# Altium footprint library My_Intlib.PcbLib: 224 footprints (part 7 of 14)
Each footprint in its own frame and in the unit in brackets; x right, y up, seen from the top. Pads: shape width x height; smd on the part's side, far side on the other; paste and mask are expansions set on the pad; w line width, h text height; cw(c..) or ccw(c..) is an arc to the next point about the centre after c.
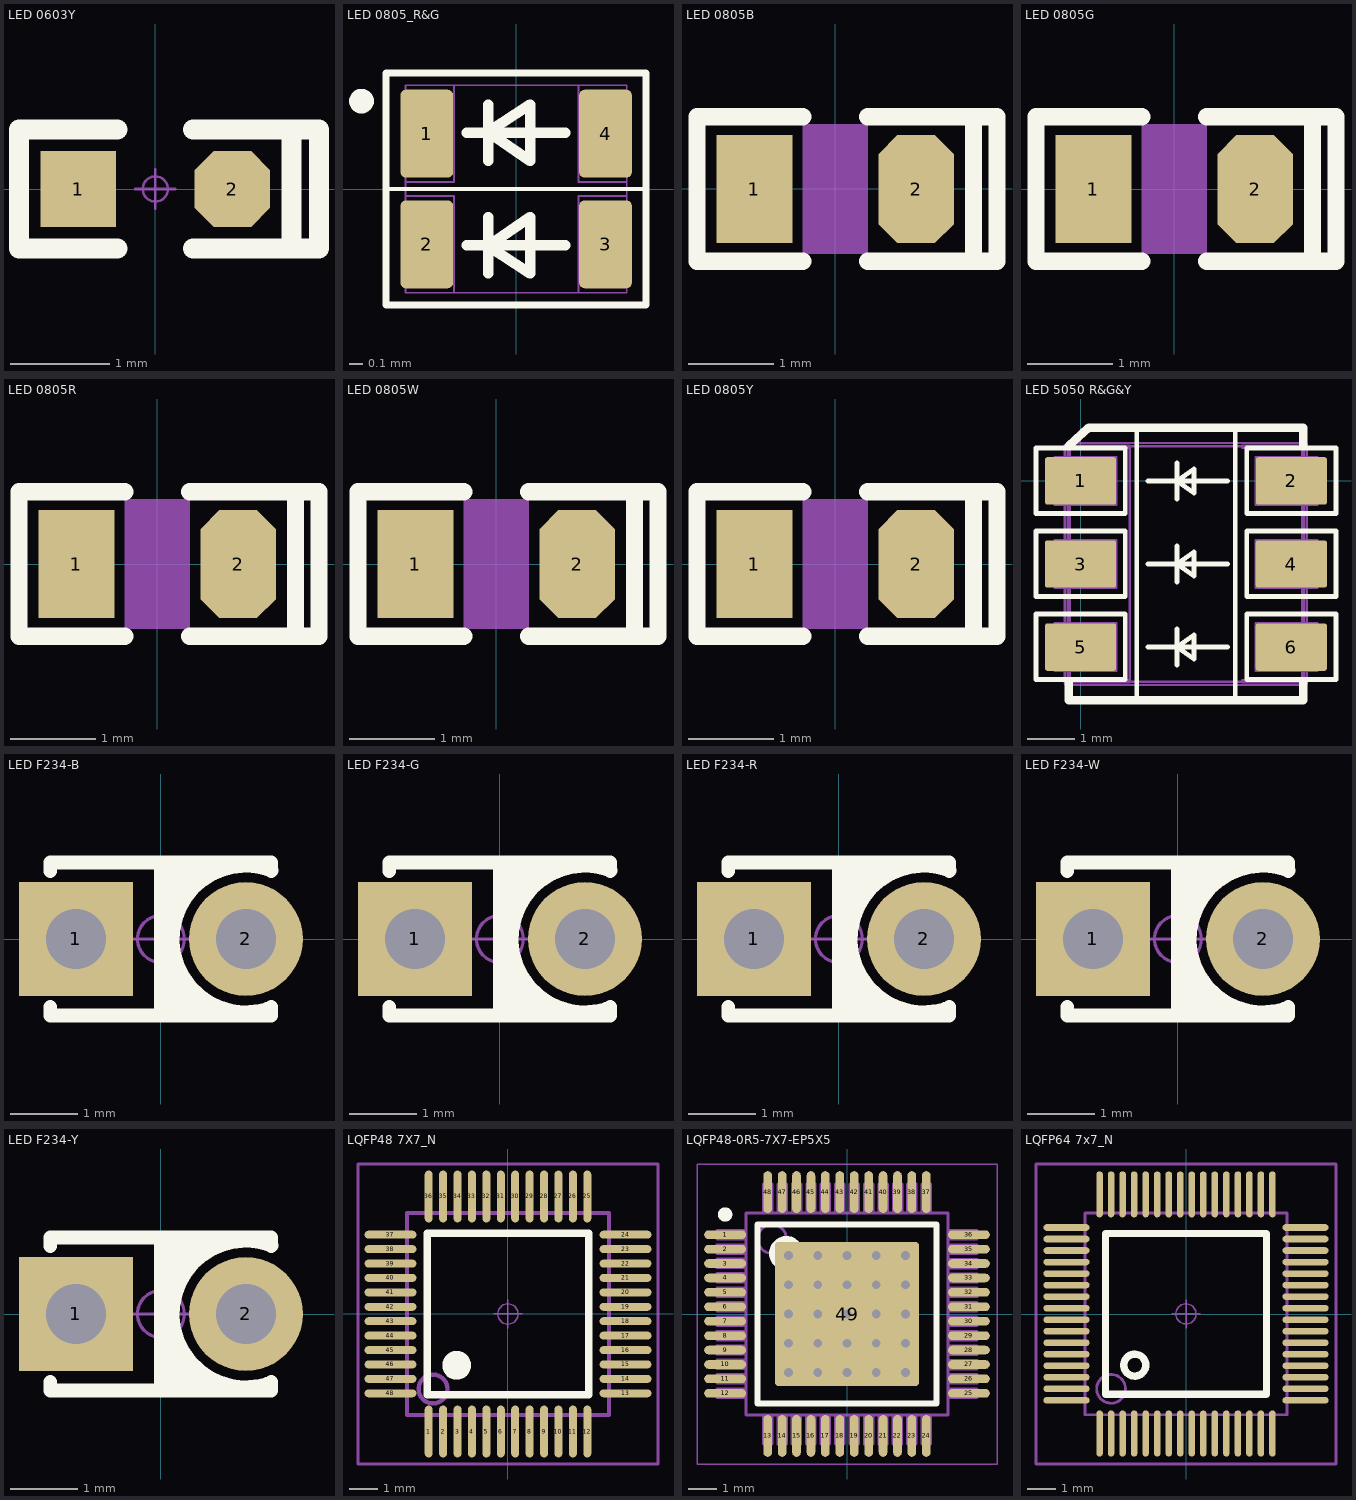
[diagram p6: the footprints below, top view; thin cyan lines are the x and y axes]

## LED 0603Y [mil] "黄色0603LED"
pads (2):
  rect 30x30 smd: 1(-30.59,0)
  oct 30x30 smd: 2(30.59,0)
Top Overlay:
  lines w8: -15,-23.62 -54.13,-23.62 -54.13,23.62 -15,23.62 ; 15,-23.62 65,-23.62 65,23.62 15,23.62 ; 54.13,-23.62 54.13,23.62
Top Value:
  text ".Comment" at 84.09,-26.46 h35
Top Assembly:
  text ".Designator" at 84.09,4.78 h35
Mechanical 15:
  circle w1: c0,0 r5
  lines w1: -7.87,0 7.87,0 ; 0,-7.87 0,7.87
3D body "LED 0603-Y.STEP": height 18.36, standoff -0.16, extent -31.5,-16.04 31.5,15.54
3D body "LED 0603玻璃罩.STEP": height 23.82, standoff 8.07, extent -23.63,-15.75 23.62,15.74

## LED 0805_R&G [mm] "LED红绿双色，0805，1.6mm*1.5mm"
pads (4):
  rrect20% 0.381x0.635 smd mask+0.038: 1(-0.646,0.4) 2(-0.646,-0.4) 3(0.646,-0.4) 4(0.646,0.4)
Top Overlay:
  circle w0.127: c-1.118,0.635 r0.025
  lines w0.025: -0.94,0 0.94,0
  lines w0.051: -0.94,-0.838 0.94,-0.838 0.94,0 0.94,0.838 -0.94,0.838 -0.94,0 -0.94,-0.838
  lines w0.076: -0.356,-0.406 0.356,-0.406 ; -0.356,0.406 0.356,0.406 ; -0.203,-0.61 -0.203,-0.411 ; -0.203,-0.203 -0.203,-0.401 ccw(c-0.198,-0.401) -0.198,-0.406 ccw(c-0.198,-0.411) -0.203,-0.411 ; -0.203,0.203 -0.203,0.401 cw(c-0.198,0.401) -0.198,0.406 cw(c-0.198,0.411) -0.203,0.411 ; -0.203,0.61 -0.203,0.411 ; -0.203,-0.411 0.102,-0.61 0.102,-0.203 -0.203,-0.411 ; -0.203,0.411 0.102,0.61 0.102,0.203 -0.203,0.411
Top Value:
  text ".Comment" at 1.168,-0.687 h0.89
Top Assembly:
  text ".Designator" at 1.168,0.106 h0.89
Mechanical 15:
  lines w0.013: -0.575,-0.05 -0.8,-0.05 ; -0.575,0.05 -0.8,0.05 ; 0.575,-0.05 0.8,-0.05 ; 0.575,0.05 0.8,0.05 ; -0.8,-0.75 -0.8,0.75 ; -0.8,-0.75 -0.8,-0.625 ccw(c-0.8,-0.4) -0.8,-0.175 -0.8,0.175 ccw(c-0.8,0.4) -0.8,0.625 -0.8,0.75 ; -0.8,-0.75 0.8,-0.75 ; -0.8,-0.75 0.8,-0.75 ; -0.8,-0.05 -0.8,0.05 ; -0.8,-0.05 -0.45,-0.05 -0.45,-0.75 0.45,-0.75 0.45,-0.05 0.8,-0.05 ; -0.8,0.05 -0.45,0.05 -0.45,0.75 0.45,0.75 0.45,0.05 0.8,0.05 ; -0.8,0.75 0.8,0.75 ; -0.8,0.75 0.8,0.75 ; 0.8,-0.75 0.8,-0.625 cw(c0.8,-0.4) 0.8,-0.175 0.8,0.175 cw(c0.8,0.4) 0.8,0.625 0.8,0.75 ; 0.8,-0.75 0.8,0.75 ; 0.8,-0.05 0.8,0.05
3D body "黄绿双色LED.STEP": height 0.15, standoff 0, extent -0.775,-0.75 0.825,0.75
3D body "黄绿双色LED灯罩.STEP": height 0.4, standoff 0.1, extent -0.553,-0.75 0.597,0.75

## LED 0805B [mil] "蓝色0805LED"
pads (2):
  rect 35x50 smd: 1(-37.4,-0.01)
  oct 35x50 smd: 2(37.4,-0.01)
Top Overlay:
  lines w8: -15,-33.47 -63.98,-33.47 -63.98,33.46 -15,33.46 ; 15,-33.47 74.8,-33.47 74.8,33.46 15,33.46 ; 63.98,-33.47 63.98,32.48
Mechanical 1:
  pour cut-out: -15,30 15,30 15,-30 -15,-30
Top Value:
  text ".Comment" at -52,-100.05 h35
Top Assembly:
  text ".Designator" at -52,-68.81 h35
Mechanical 15:
  circle w1: c0,0 r5
  lines w1: -7.87,0 7.87,0 ; 0,-7.87 0,7.87
3D body "LED 0805玻璃罩.STEP": height 31.69, standoff 12.01, extent -29.53,-24.61 29.53,24.6
3D body "LED 0805-B.STEP": height 26.33, standoff -0.16, extent -39.36,-24.64 39.37,24.65

## LED 0805G [mil] "绿色0805LED"
pads (2):
  rect 35x50 smd: 1(-37.4,0)
  oct 35x50 smd: 2(37.4,0)
Top Overlay:
  lines w8: -15,-33.46 -63.98,-33.46 -63.98,33.46 -15,33.46 ; 15,-33.46 74.8,-33.46 74.8,33.46 15,33.46 ; 63.98,-33.46 63.98,32.48
Mechanical 1:
  pour cut-out: -15,30 15,30 15,-30 -15,-30
Top Value:
  text ".Comment" at -49,-95.05 h35
Top Assembly:
  text ".Designator" at -49,-63.81 h35
Mechanical 15:
  circle w1: c0,0 r5
  lines w1: -7.87,0 7.87,0 ; 0,-7.87 0,7.87
3D body "LED 0805-G.STEP": height 26.33, standoff -0.16, extent -39.37,-24.64 39.37,24.65
3D body "LED 0805玻璃罩.STEP": height 31.69, standoff 12.01, extent -29.53,-24.6 29.53,24.6

## LED 0805R [mil] "红色0805LED"
pads (2):
  rect 35x50 smd: 1(-37.41,0)
  oct 35x50 smd: 2(37.4,0)
Top Overlay:
  lines w8: -15,-33.46 -63.98,-33.46 -63.98,33.47 -15,33.47 ; 15,-33.46 74.8,-33.46 74.8,33.47 15,33.47 ; 63.98,-33.46 63.98,32.48
Mechanical 1:
  pour cut-out: -15,30 15,30 15,-30 -15,-30
Top Value:
  text ".Comment" at -58,-96.05 h35
Top Assembly:
  text ".Designator" at -58,-64.81 h35
Mechanical 15:
  circle w1: c0,0 r5
  lines w1: -7.87,0 7.87,0 ; 0,-7.87 0,7.87
3D body "LED 0805玻璃罩.STEP": height 31.69, standoff 12.01, extent -29.53,-24.6 29.53,24.61
3D body "LED 0805-R.STEP": height 26.33, standoff -0.16, extent -39.37,-24.64 39.37,24.65

## LED 0805W [mm] "白色0805LED"
pads (2):
  rect 0.889x1.27 smd: 1(-0.95,0)
  oct 0.889x1.27 smd: 2(0.95,0)
Top Overlay:
  lines w0.203: -0.381,-0.85 -1.625,-0.85 -1.625,0.85 -0.381,0.85 ; 0.381,-0.85 1.9,-0.85 1.9,0.85 0.381,0.85 ; 1.625,-0.85 1.625,0.825
Mechanical 1:
  pour cut-out: -0.381,0.762 0.381,0.762 0.381,-0.762 -0.381,-0.762
Top Value:
  text ".Comment" at -1.219,-2.389 h0.89
Top Assembly:
  text ".Designator" at -1.219,-1.595 h0.89
Mechanical 15:
  circle w0.025: c0,0 r0.127
  lines w0.025: -0.2,0 0.2,0 ; 0,-0.2 0,0.2
3D body "LED 0805-W.STEP": height 0.67, standoff 0, extent -1,-0.626 1,0.626
3D body "LED 0805玻璃罩.STEP": height 0.8, standoff 0.31, extent -0.75,-0.625 0.75,0.625

## LED 0805Y [mm] "黄色0805LED"
pads (2):
  rect 0.889x1.27 smd: 1(-0.95,0)
  oct 0.889x1.27 smd: 2(0.95,0)
Top Overlay:
  lines w0.203: -0.381,-0.85 -1.625,-0.85 -1.625,0.85 -0.381,0.85 ; 0.381,-0.85 1.9,-0.85 1.9,0.85 0.381,0.85 ; 1.625,-0.85 1.625,0.825
Mechanical 1:
  pour cut-out: -0.381,0.762 0.381,0.762 0.381,-0.762 -0.381,-0.762
Top Value:
  text ".Comment" at -1.143,-2.592 h0.89
Top Assembly:
  text ".Designator" at -1.143,-1.799 h0.89
Mechanical 15:
  circle w0.025: c0,0 r0.127
  lines w0.025: -0.2,0 0.2,0 ; 0,-0.2 0,0.2
3D body "LED 0805-Y.STEP": height 0.67, standoff 0, extent -1,-0.626 1,0.626
3D body "LED 0805玻璃罩.STEP": height 0.8, standoff 0.31, extent -0.75,-0.625 0.75,0.625

## LED 5050 R&G&Y [mm] "LED红绿黄3色，5050，5mm*5mm"
pads (6):
  rrect10% 1.5x1 smd: 1(0,0) 2(4.442,0) 3(0,-1.75) 4(4.44,-1.75) 5(0,-3.5) 6(4.44,-3.5)
Top Overlay:
  lines w0.1: 0.546,1.118 3.894,1.118 ; 1.041,1.118 3.399,1.118 ; 1.181,-4.618 1.183,-4.229 1.183,1.118 ; 1.422,-3.5 3.099,-3.5 ; 1.422,-1.75 3.099,-1.75 ; 1.422,0 3.099,0 ; 2.032,-3.881 2.032,-3.119 ; 2.032,-2.131 2.032,-1.369 ; 2.032,-0.381 2.032,0.381 ; 3.256,-4.618 3.258,-4.229 3.258,1.118 ; -0.94,-4.186 0.94,-4.186 0.94,-2.805 -0.94,-2.805 -0.94,-4.186 ; -0.94,-2.436 0.94,-2.436 0.94,-1.055 -0.94,-1.055 -0.94,-2.436 ; -0.94,-0.686 0.94,-0.686 0.94,0.695 -0.94,0.695 -0.94,-0.686 ; 2.032,-3.5 2.388,-3.754 2.388,-3.246 2.032,-3.5 ; 2.032,-1.75 2.388,-2.004 2.388,-1.496 2.032,-1.75 ; 2.032,0 2.388,-0.254 2.388,0.254 2.032,0 ; 3.502,-4.186 5.381,-4.186 5.381,-2.805 3.502,-2.805 3.502,-4.186 ; 3.502,-2.436 5.381,-2.436 5.381,-1.055 3.502,-1.055 3.502,-2.436 ; 3.502,-0.686 5.381,-0.686 5.381,0.695 3.502,0.695 3.502,-0.686
  lines w0.178: -0.254,-4.237 -0.254,-4.618 4.696,-4.618 4.696,-4.237 ; -0.254,0.737 0.169,1.118 4.696,1.118 4.696,0.737
Top Value:
  text ".Comment" at 5.664,-2.135 h0.89
Top Assembly:
  text ".Designator" at 5.664,-1.341 h0.89
Mechanical 15:
  drawing of 4346 lines, arcs and shapes, not listed
3D body "5050 RGB led灯罩.STEP": height 1.35, standoff 0.95, extent 0.051,-3.927 4.442,0.473
3D body "5050 RGB led.STEP": height 1.6, standoff 0, extent -0.561,-4.3 4.979,0.8

## LED F234-B [mm] "蓝色2mm*3mm*4mm(长*宽*高)"
pads (2):
  rect 1.7x1.7 hole 0.9: 1(-1.27,0)
  round 1.7 hole 0.9: 2(1.27,0)
Top Overlay:
  lines w0.203: -1.651,-1.016 -1.651,-1.143 1.651,-1.143 1.651,-1.016 ; -1.651,1.016 -1.651,1.143 1.651,1.143 1.651,1.016 ; 0,-1.143 0,1.143 ; 0,-0.889 0.254,-1.143 ; 0,-0.635 0.508,-1.143 ; 0,-0.381 0.762,-1.143 ; 0,0.381 0.762,1.143 ; 0,0.635 0.508,1.143 ; 0,0.889 0.254,1.143 ; 0.127,-0.635 0.127,0.508 ; 1.584,-1.046 cw(c1.27,0) 1.654,1.023
Mechanical 15:
  circle w0.05: c0,0 r0.35
  lines w0.05: -0.5,0 0.5,0 ; 0,-0.5 0,0.5
3D body "LED F234-B.STEP": height 3.01, standoff -3.45, extent -1.52,-0.838 1.52,0.838
3D body "LED F234透明罩.STEP": height 4.05, standoff 0.05, extent -1.5,-1 1.5,1

## LED F234-G [mm] "绿色2mm*3mm*4mm(长*宽*高)"
pads (2):
  rect 1.7x1.7 hole 0.9: 1(-1.27,0)
  round 1.7 hole 0.9: 2(1.27,0)
Top Overlay:
  lines w0.203: -1.651,-1.016 -1.651,-1.143 1.651,-1.143 1.651,-1.016 ; -1.651,1.016 -1.651,1.143 1.651,1.143 1.651,1.016 ; 0,-1.143 0,1.143 ; 0,-0.889 0.254,-1.143 ; 0,-0.635 0.508,-1.143 ; 0,-0.381 0.762,-1.143 ; 0,0.381 0.762,1.143 ; 0,0.635 0.508,1.143 ; 0,0.889 0.254,1.143 ; 0.127,-0.635 0.127,0.508 ; 1.584,-1.046 cw(c1.27,0) 1.654,1.023
Mechanical 15:
  circle w0.05: c0,0 r0.35
  lines w0.05: -0.5,0 0.5,0 ; 0,-0.5 0,0.5
3D body "LED F234透明罩.STEP": height 4.05, standoff 0.05, extent -1.5,-1 1.5,1
3D body "LED F234-G.STEP": height 3.01, standoff -3.45, extent -1.52,-0.838 1.52,0.838

## LED F234-R [mm] "红色2mm*3mm*4mm(长*宽*高)"
pads (2):
  rect 1.7x1.7 hole 0.9: 1(-1.27,0)
  round 1.7 hole 0.9: 2(1.27,0)
Top Overlay:
  lines w0.203: -1.651,-1.016 -1.651,-1.143 1.651,-1.143 1.651,-1.016 ; -1.651,1.016 -1.651,1.143 1.651,1.143 1.651,1.016 ; 0,-1.143 0,1.143 ; 0,-0.889 0.254,-1.143 ; 0,-0.635 0.508,-1.143 ; 0,-0.381 0.762,-1.143 ; 0,0.381 0.762,1.143 ; 0,0.635 0.508,1.143 ; 0,0.889 0.254,1.143 ; 0.127,-0.635 0.127,0.508 ; 1.584,-1.046 cw(c1.27,0) 1.654,1.023
Mechanical 15:
  circle w0.05: c0,0 r0.35
  lines w0.05: -0.5,0 0.5,0 ; 0,-0.5 0,0.5
3D body "LED F234-R.STEP": height 3.01, standoff -3.45, extent -1.52,-0.838 1.52,0.838
3D body "LED F234透明罩.STEP": height 4.05, standoff 0.05, extent -1.5,-1 1.5,1

## LED F234-W [mm] "透明色2mm*3mm*4mm(长*宽*高)"
pads (2):
  rect 1.7x1.7 hole 0.9: 1(-1.27,0)
  round 1.7 hole 0.9: 2(1.27,0)
Top Overlay:
  lines w0.203: -1.651,-1.016 -1.651,-1.143 1.651,-1.143 1.651,-1.016 ; -1.651,1.016 -1.651,1.143 1.651,1.143 1.651,1.016 ; 0,-1.143 0,1.143 ; 0,-0.889 0.254,-1.143 ; 0,-0.635 0.508,-1.143 ; 0,-0.381 0.762,-1.143 ; 0,0.381 0.762,1.143 ; 0,0.635 0.508,1.143 ; 0,0.889 0.254,1.143 ; 0.127,-0.635 0.127,0.508 ; 1.584,-1.046 cw(c1.27,0) 1.654,1.023
Mechanical 15:
  circle w0.05: c0,0 r0.35
  lines w0.05: -0.5,0 0.5,0 ; 0,-0.5 0,0.5
3D body "LED F234-W.STEP": height 3.01, standoff -3.45, extent -1.52,-0.838 1.52,0.838
3D body "LED F234透明罩.STEP": height 4.05, standoff 0.05, extent -1.5,-1 1.5,1

## LED F234-Y [mm] "黄色2mm*3mm*4mm(长*宽*高)"
pads (2):
  rect 1.7x1.7 hole 0.9: 1(-1.27,0)
  round 1.7 hole 0.9: 2(1.27,0)
Top Overlay:
  lines w0.203: -1.651,-1.016 -1.651,-1.143 1.651,-1.143 1.651,-1.016 ; -1.651,1.016 -1.651,1.143 1.651,1.143 1.651,1.016 ; 0,-1.143 0,1.143 ; 0,-0.889 0.254,-1.143 ; 0,-0.635 0.508,-1.143 ; 0,-0.381 0.762,-1.143 ; 0,0.381 0.762,1.143 ; 0,0.635 0.508,1.143 ; 0,0.889 0.254,1.143 ; 0.127,-0.635 0.127,0.508 ; 1.584,-1.046 cw(c1.27,0) 1.654,1.023
Mechanical 15:
  circle w0.05: c0,0 r0.35
  lines w0.05: -0.5,0 0.5,0 ; 0,-0.5 0,0.5
3D body "LED F234-Y.STEP": height 3.01, standoff -3.45, extent -1.52,-0.838 1.52,0.838
3D body "LED F234透明罩.STEP": height 4.05, standoff 0.05, extent -1.5,-1 1.5,1

## LQFP48 7X7_N [mm] "48脚，体宽7x7mm，脚距0.5mm"
height 1.6
pads (48):
  oval 0.279x1.8 smd: 1(-2.75,-4.075) 2(-2.25,-4.075) 3(-1.75,-4.075) 4(-1.25,-4.075) 5(-0.75,-4.075) 6(-0.25,-4.075) 7(0.25,-4.075) 8(0.75,-4.075) 9(1.25,-4.075) 10(1.75,-4.075) 11(2.25,-4.075) 12(2.75,-4.075) 25(2.75,4.075) 26(2.25,4.075) 27(1.75,4.075) 28(1.25,4.075) 29(0.75,4.075) 30(0.25,4.075) 31(-0.25,4.075) 32(-0.75,4.075) 33(-1.25,4.075) 34(-1.75,4.075) 35(-2.25,4.075) 36(-2.75,4.075)
  oval 1.8x0.279 smd: 13(4.075,-2.75) 14(4.075,-2.25) 15(4.075,-1.75) 16(4.075,-1.25) 17(4.075,-0.75) 18(4.075,-0.25) 19(4.075,0.25) 20(4.075,0.75) 21(4.075,1.25) 22(4.075,1.75) 23(4.075,2.25) 24(4.075,2.75) 37(-4.075,2.75) 38(-4.075,2.25) 39(-4.075,1.75) 40(-4.075,1.25) 41(-4.075,0.75) 42(-4.075,0.25) 43(-4.075,-0.25) 44(-4.075,-0.75) 45(-4.075,-1.25) 46(-4.075,-1.75) 47(-4.075,-2.25) 48(-4.075,-2.75)
Top Overlay:
  circle w0.5: c-1.778,-1.778 r0.25
  lines w0.254: -2.794,-2.794 2.794,-2.794 2.794,2.794 -2.794,2.794 -2.794,-2.794
Top Value:
  text ".Comment" at 5.69,0.126 h0.89
Top Assembly:
  text ".Designator" at 5.69,0.919 h0.89
Mechanical 13:
  circle w0.15: c-2.6,-2.6 r0.5
  lines w0.15: -3.5,-3.5 -3.5,3.5 3.5,3.5 3.5,-3.5 -3.5,-3.5
Mechanical 15:
  circle w0.05: c0,0 r0.35
  lines w0.05: -0.5,0 0.5,0 ; 0,-0.5 0,0.5
  lines w0.1: -5.2,-5.2 5.2,-5.2 5.2,5.2 -5.2,5.2 -5.2,-5.2
3D body "LQFP48-7x7.STEP": height 1.45, standoff 0, extent -4.503,-4.503 4.503,4.503

## LQFP48-0R5-7X7-EP5X5 [mm] "TSQFP, 48-Leads, Body 7.00x7.00mm, Pitch 0.50mm, IPC Medium Density"
height 1.45
pads (49):
  oval 1.45x0.3 smd mask+0.05: 1(-4.225,2.75) 2(-4.225,2.25) 3(-4.225,1.75) 4(-4.225,1.25) 5(-4.225,0.75) 6(-4.225,0.25) 7(-4.225,-0.25) 8(-4.225,-0.75) 9(-4.225,-1.25) 10(-4.225,-1.75) 11(-4.225,-2.25) 12(-4.225,-2.75) 25(4.225,-2.75) 26(4.225,-2.25) 27(4.225,-1.75) 28(4.225,-1.25) 29(4.225,-0.75) 30(4.225,-0.25) 31(4.225,0.25) 32(4.225,0.75) 33(4.225,1.25) 34(4.225,1.75) 35(4.225,2.25) 36(4.225,2.75)
  oval 0.3x1.45 smd mask+0.05: 13(-2.75,-4.225) 14(-2.25,-4.225) 15(-1.75,-4.225) 16(-1.25,-4.225) 17(-0.75,-4.225) 18(-0.25,-4.225) 19(0.25,-4.225) 20(0.75,-4.225) 21(1.25,-4.225) 22(1.75,-4.225) 23(2.25,-4.225) 24(2.75,-4.225) 37(2.75,4.225) 38(2.25,4.225) 39(1.75,4.225) 40(1.25,4.225) 41(0.75,4.225) 42(0.25,4.225) 43(-0.25,4.225) 44(-0.75,4.225) 45(-1.25,4.225) 46(-1.75,4.225) 47(-2.25,4.225) 48(-2.75,4.225)
  rrect5% 5x5 smd mask+0.05: 49(0,0)
via 1.016,1.016 diameter 0.584 hole 0.305
via 2.032,0 diameter 0.584 hole 0.305
via 1.016,0 diameter 0.584 hole 0.305
via 2.032,1.016 diameter 0.584 hole 0.305
via 0,1.016 diameter 0.584 hole 0.305
via 0,0 diameter 0.584 hole 0.305
via -2.032,-2.032 diameter 0.584 hole 0.305
via 2.032,-2.032 diameter 0.584 hole 0.305
via 1.016,-2.032 diameter 0.584 hole 0.305
via -1.016,-2.032 diameter 0.584 hole 0.305
via 0,-2.032 diameter 0.584 hole 0.305
via -2.032,2.032 diameter 0.584 hole 0.305
via 2.032,2.032 diameter 0.584 hole 0.305
via 1.016,2.032 diameter 0.584 hole 0.305
via -1.016,2.032 diameter 0.584 hole 0.305
via 0,2.032 diameter 0.584 hole 0.305
via -2.032,1.016 diameter 0.584 hole 0.305
via -2.032,0 diameter 0.584 hole 0.305
via -2.032,-1.016 diameter 0.584 hole 0.305
via 2.032,-1.016 diameter 0.584 hole 0.305
via 0,-1.016 diameter 0.584 hole 0.305
via -1.016,0 diameter 0.584 hole 0.305
via -1.016,-1.016 diameter 0.584 hole 0.305
via -1.016,1.016 diameter 0.584 hole 0.305
via 1.016,-1.016 diameter 0.584 hole 0.305
Top Overlay:
  circle w0.6: c-2.1,2.1 r0.3
  circle w0.25: c-4.225,3.45 r0.125
  lines w0.2: -3.1,-3.1 3.1,-3.1 3.1,3.1 -3.1,3.1 -3.1,-3.1
Top Value:
  text ".Comment" at -1.266,-1.135 h1
Top Assembly:
  circle w0.1: c-2.6,2.6 r0.5
  lines w0.1: -4.502,-2.897 -4.502,-2.6 -3.5,-2.6 ; -4.502,-2.397 -4.502,-2.1 -3.5,-2.1 ; -4.502,-1.897 -4.502,-1.6 -3.5,-1.6 ; -4.502,-1.397 -4.502,-1.1 -3.5,-1.1 ; -4.502,-0.897 -4.502,-0.6 -3.5,-0.6 ; -4.502,-0.397 -4.502,-0.1 -3.5,-0.1 ; -4.502,0.103 -4.502,0.4 -3.5,0.4 ; -4.502,0.603 -4.502,0.9 -3.5,0.9 ; -4.502,1.103 -4.502,1.4 -3.5,1.4 ; -4.502,1.603 -4.502,1.9 -3.5,1.9 ; -4.502,2.103 -4.502,2.4 -3.5,2.4 ; -4.502,2.603 -4.502,2.9 -3.5,2.9 ; -4.5,-2.897 -3.5,-2.897 ; -4.5,-2.397 -3.5,-2.397 ; -4.5,-1.897 -3.5,-1.897 ; -4.5,-1.397 -3.5,-1.397 ; -4.5,-0.897 -3.5,-0.897 ; -4.5,-0.397 -3.5,-0.397 ; -4.5,0.103 -3.5,0.103 ; -4.5,0.603 -3.5,0.603 ; -4.5,1.103 -3.5,1.103 ; -4.5,1.603 -3.5,1.603 ; -4.5,2.103 -3.5,2.103 ; -4.5,2.603 -3.5,2.603 ; -2.9,-3.5 -2.9,-4.502 -2.603,-4.502 ; -2.897,3.5 -2.897,4.5 ; -2.897,4.502 -2.6,4.502 -2.6,3.5 ; -2.603,-4.5 -2.603,-3.5 ; -2.4,-3.5 -2.4,-4.502 -2.103,-4.502 ; -2.397,3.5 -2.397,4.5 ; -2.397,4.502 -2.1,4.502 -2.1,3.5 ; -2.103,-4.5 -2.103,-3.5 ; -1.9,-3.5 -1.9,-4.502 -1.603,-4.502 ; -1.897,3.5 -1.897,4.5 ; -1.897,4.502 -1.6,4.502 -1.6,3.5 ; -1.603,-4.5 -1.603,-3.5 ; -1.4,-3.5 -1.4,-4.502 -1.103,-4.502 ; -1.397,3.5 -1.397,4.5 ; -1.397,4.502 -1.1,4.502 -1.1,3.5 ; -1.103,-4.5 -1.103,-3.5 ; -0.9,-3.5 -0.9,-4.502 -0.603,-4.502 ; -0.897,3.5 -0.897,4.5 ; -0.897,4.502 -0.6,4.502 -0.6,3.5 ; -0.603,-4.5 -0.603,-3.5 ; -0.4,-3.5 -0.4,-4.502 -0.103,-4.502 ; -0.397,3.5 -0.397,4.5 ; -0.397,4.502 -0.1,4.502 -0.1,3.5 ; -0.103,-4.5 -0.103,-3.5 ; 0.1,-3.5 0.1,-4.502 0.397,-4.502 ; 0.103,3.5 0.103,4.5 ; 0.103,4.502 0.4,4.502 0.4,3.5 ; 0.397,-4.5 0.397,-3.5 ; 0.6,-3.5 0.6,-4.502 0.897,-4.502 ; 0.603,3.5 0.603,4.5 ; 0.603,4.502 0.9,4.502 0.9,3.5 ; 0.897,-4.5 0.897,-3.5 ; 1.1,-3.5 1.1,-4.502 1.397,-4.502 ; 1.103,3.5 1.103,4.5 ; 1.103,4.502 1.4,4.502 1.4,3.5 ; 1.397,-4.5 1.397,-3.5 ; 1.6,-3.5 1.6,-4.502 1.897,-4.502 ; 1.603,3.5 1.603,4.5 ; 1.603,4.502 1.9,4.502 1.9,3.5 ; 1.897,-4.5 1.897,-3.5 ; 2.1,-3.5 2.1,-4.502 2.397,-4.502 ; 2.103,3.5 2.103,4.5 ; 2.103,4.502 2.4,4.502 2.4,3.5 ; 2.397,-4.5 2.397,-3.5 ; 2.6,-3.5 2.6,-4.502 2.897,-4.502 ; 2.603,3.5 2.603,4.5 ; 2.603,4.502 2.9,4.502 2.9,3.5 ; 2.897,-4.5 2.897,-3.5 ; 3.5,-2.9 4.502,-2.9 4.502,-2.603 ; 3.5,-2.603 4.5,-2.603 ; 3.5,-2.4 4.502,-2.4 4.502,-2.103 ; 3.5,-2.103 4.5,-2.103 ; 3.5,-1.9 4.502,-1.9 4.502,-1.603 ; 3.5,-1.603 4.5,-1.603 ; 3.5,-1.4 4.502,-1.4 4.502,-1.103 ; 3.5,-1.103 4.5,-1.103 ; 3.5,-0.9 4.502,-0.9 4.502,-0.603 ; 3.5,-0.603 4.5,-0.603 ; 3.5,-0.4 4.502,-0.4 4.502,-0.103 ; 3.5,-0.103 4.5,-0.103 ; 3.5,0.1 4.502,0.1 4.502,0.397 ; 3.5,0.397 4.5,0.397 ; 3.5,0.6 4.502,0.6 4.502,0.897 ; 3.5,0.897 4.5,0.897 ; 3.5,1.1 4.502,1.1 4.502,1.397 ; 3.5,1.397 4.5,1.397 ; 3.5,1.6 4.502,1.6 4.502,1.897 ; 3.5,1.897 4.5,1.897 ; 3.5,2.1 4.502,2.1 4.502,2.397 ; 3.5,2.397 4.5,2.397 ; 3.5,2.6 4.502,2.6 4.502,2.897 ; 3.5,2.897 4.5,2.897 ; -3.5,-3.5 -3.5,3.5 3.5,3.5 3.5,-3.5 -3.5,-3.5
  text ".Designator" at -1.295,-0.274 h1
Mechanical 15:
  lines w0.05: -5.2,-5.2 5.2,-5.2 5.2,5.2 -5.2,5.2 -5.2,-5.2
  lines w0.1: -0.5,0 0.5,0 ; 0,-0.5 0,0.5
3D body "TSQFP50P900X900X145-48N.step": height 1.45, standoff 0, extent -4.5,-4.5 4.5,4.5

## LQFP64 7x7_N [mm] "64脚，体宽：7x7mm, 脚距：0.4mm"
pads (64):
  oval 0.23x1.6 smd: 1(-3,-4.146) 2(-2.6,-4.146) 3(-2.2,-4.146) 4(-1.8,-4.146) 5(-1.4,-4.146) 6(-1,-4.146) 7(-0.6,-4.146) 8(-0.2,-4.146) 9(0.2,-4.146) 10(0.6,-4.146) 11(1,-4.146) 12(1.4,-4.146) 13(1.8,-4.146) 14(2.2,-4.146) 15(2.6,-4.146) 16(3,-4.146) 33(3,4.152) 34(2.6,4.152) 35(2.2,4.152) 36(1.8,4.152) 37(1.4,4.152) 38(1,4.152) 39(0.6,4.152) 40(0.2,4.152) 41(-0.2,4.152) 42(-0.6,4.152) 43(-1,4.152) 44(-1.4,4.152) 45(-1.8,4.152) 46(-2.2,4.152) 47(-2.6,4.152) 48(-3,4.152)
  oval 1.6x0.23 smd: 17(4.149,-2.997) 18(4.149,-2.597) 19(4.149,-2.197) 20(4.149,-1.797) 21(4.149,-1.397) 22(4.149,-0.997) 23(4.149,-0.597) 24(4.149,-0.197) 25(4.149,0.203) 26(4.149,0.603) 27(4.149,1.003) 28(4.149,1.403) 29(4.149,1.803) 30(4.149,2.203) 31(4.149,2.603) 32(4.149,3.003) 49(-4.149,3.003) 50(-4.149,2.603) 51(-4.149,2.203) 52(-4.149,1.803) 53(-4.149,1.403) 54(-4.149,1.003) 55(-4.149,0.603) 56(-4.149,0.203) 57(-4.149,-0.197) 58(-4.149,-0.597) 59(-4.149,-0.997) 60(-4.149,-1.397) 61(-4.149,-1.797) 62(-4.149,-2.197) 63(-4.149,-2.597) 64(-4.149,-2.997)
Top Overlay:
  circle w0.254: c-1.778,-1.775 r0.381
  lines w0.254: -2.794,-2.791 -2.794,2.797 2.794,2.797 2.794,-2.791 -2.794,-2.791
Top Value:
  text ".Comment" at 5.486,0.1 h0.89
Top Assembly:
  text ".Designator" at 5.486,0.894 h0.89
Mechanical 13:
  circle w0.1: c-2.6,-2.597 r0.5
  lines w0.1: -3.5,-3.497 -3.5,3.503 3.5,3.503 3.5,-3.497 -3.5,-3.497
Mechanical 15:
  circle w0.05: c0,0.003 r0.35
  lines w0.05: -0.5,0.003 0.5,0.003 ; 0,-0.497 0,0.503
  lines w0.1: -5.207,-5.207 5.207,-5.207 5.207,5.207 -5.207,5.207 -5.207,-5.207
3D body "LQFP64-7x7.STEP": height 1.45, standoff 0, extent -4.503,-4.5 4.503,4.506